# Altium schematic symbol library SCHLIB.SchLib: 2608 symbols (part 14 of 20)
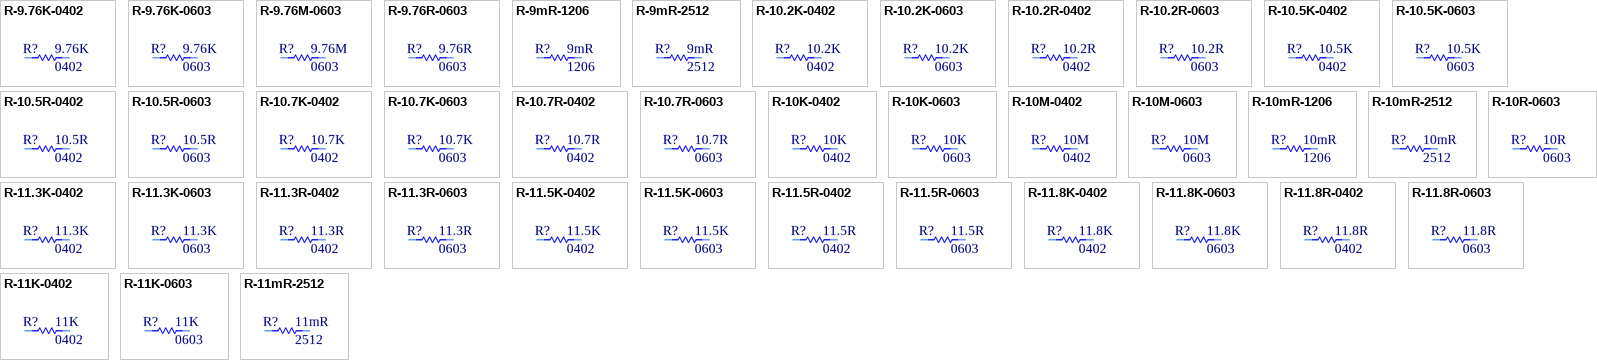
[diagram p96: symbols R-9.76K-0402 to R-11mR-2512]

## R-9.76K-0402
designator R?, comment Package: 0402  (hidden comment: 9.76K)
RES 9.76K OHM 1% 1/16W 0402; Manufacturer Part Number: RC0402FR-079K76L; Manufacturer: YAGEO; Tolerance: 0.01; Power: 0.063W; Temperature Coefficient: ±100ppm/°C; Object  Type: Part; Design Item ID: R-9.76K-0402; Value: 9.76K; Composition: Thick Film; Features: Moisture Resistant; Operating Temperature: -55°C ~ 155°C; Height - Seated (Max): 0.40mm; Category: Resistor
footprint R0402
pins: 1, 2

## R-9.76K-0603
designator R?, comment Package: 0603  (hidden comment: 9.76K)
RES SMD 9.76K OHM 1% 1/10W 0603; Manufacturer Part Number: CRCW06039K76FKEA; Manufacturer: Vishay Dale; Tolerance: 0.01; Power: 0.1W; Temperature Coefficient: ±100ppm/°C; Object  Type: Part; Design Item ID: R-9.76K-0603; Value: 9.76K; Composition: Thick Film; Features: Automotive AEC-Q200; Operating Temperature: -55°C ~ 155°C; Height - Seated (Max): 0.50mm; Category: Resistor
footprint R0603
pins: 1, 2

## R-9.76M-0603
designator R?, comment Package: 0603  (hidden comment: 9.76M)
RES SMD 9.76M OHM 1% 1/10W 0603; Manufacturer Part Number: CRCW06039M76FKEA; Manufacturer: Vishay Dale; Tolerance: 0.01; Power: 0.1W; Temperature Coefficient: ±100ppm/°C; Object  Type: Part; Design Item ID: R-9.76M-0603; Value: 9.76M; Composition: Thick Film; Features: Automotive AEC-Q200; Operating Temperature: -55°C ~ 155°C; Height - Seated (Max): 0.50mm; Category: Resistor
footprint R0603
pins: 1, 2

## R-9.76R-0603
designator R?, comment Package: 0603  (hidden comment: 9.76R)
RES SMD 9.76 OHM 1% 1/10W 0603; Manufacturer Part Number: CRCW06039R76FKEA; Manufacturer: Vishay Dale; Tolerance: 0.01; Power: 0.1W; Temperature Coefficient: ±100ppm/°C; Object  Type: Part; Design Item ID: R-9.76R-0603; Value: 9.76R; Composition: Thick Film; Features: Automotive AEC-Q200; Operating Temperature: -55°C ~ 155°C; Height - Seated (Max): 0.50mm; Category: Resistor
footprint R0603
pins: 1, 2

## R-9mR-1206
designator R?, comment Package: 1206  (hidden comment: 9mR)
RES 0.009 OHM 1% 1/4W 1206; Manufacturer Part Number: WSL12069L000FEA; Manufacturer: Vishay Dale; Tolerance: 0.01; Power: 0.25W; Temperature Coefficient: ±75ppm/°C; Object  Type: Part; Design Item ID: R-9mR-1206; Value: 9mR; Composition: Metal Element; Features: Anti-Sulfur, Automotive AEC-Q200, Current Sense, Moisture Resistant, Pulse Withstanding; Operating Temperature: -65°C ~ 170°C; Height - Seated (Max): 0.89mm; Category: Resistor
footprint R1206
pins: 1, 2

## R-9mR-2512
designator R?, comment Package: 2512  (hidden comment: 9mR)
RES 0.009 OHM 1% 1W 2512; Manufacturer Part Number: WSL25129L000FEA; Manufacturer: Vishay Dale; Tolerance: 0.01; Temperature Coefficient: ±75ppm/°C; Object  Type: Part; Design Item ID: R-9mR-2512; Value: 9mR; Power: 1W; Composition: Metal Element; Features: Anti-Sulfur, Automotive AEC-Q200, Current Sense, Moisture Resistant, Pulse Withstanding; Operating Temperature: -65°C ~ 170°C; Height - Seated (Max): 0.89mm; Category: Resistor
footprint R2512
pins: 1, 2

## R-10.2K-0402
designator R?, comment Package: 0402  (hidden comment: 10.2K)
RES 10.2K OHM 1% 1/16W 0402; Manufacturer Part Number: RC0402FR-0710K2L; Manufacturer: YAGEO; Tolerance: 0.01; Power: 0.063W; Temperature Coefficient: ±100ppm/°C; Object  Type: Part; Design Item ID: R-10.2K-0402; Value: 10.2K; Composition: Thick Film; Features: Moisture Resistant; Operating Temperature: -55°C ~ 155°C; Height - Seated (Max): 0.40mm; Category: Resistor
footprint R0402
pins: 1, 2

## R-10.2K-0603
designator R?, comment Package: 0603  (hidden comment: 10.2K)
RES SMD 10.2K OHM 1% 1/10W 0603; Manufacturer Part Number: CRCW060310K2FKEA; Manufacturer: Vishay Dale; Tolerance: 0.01; Power: 0.1W; Temperature Coefficient: ±100ppm/°C; Object  Type: Part; Design Item ID: R-10.2K-0603; Value: 10.2K; Composition: Thick Film; Features: Automotive AEC-Q200; Operating Temperature: -55°C ~ 155°C; Height - Seated (Max): 0.50mm; Category: Resistor
footprint R0603
pins: 1, 2

## R-10.2R-0402
designator R?, comment Package: 0402  (hidden comment: 10.2R)
RES 10.2 OHM 1% 1/16W 0402; Manufacturer Part Number: RC0402FR-0710R2L; Manufacturer: YAGEO; Tolerance: 0.01; Power: 0.063W; Temperature Coefficient: ±100ppm/°C; Object  Type: Part; Design Item ID: R-10.2R-0402; Value: 10.2R; Composition: Thick Film; Features: Moisture Resistant; Operating Temperature: -55°C ~ 155°C; Height - Seated (Max): 0.40mm; Category: Resistor
footprint R0402
pins: 1, 2

## R-10.2R-0603
designator R?, comment Package: 0603  (hidden comment: 10.2R)
RES SMD 10.2 OHM 1% 1/10W 0603; Manufacturer Part Number: CRCW060310R2FKEA; Manufacturer: Vishay Dale; Tolerance: 0.01; Power: 0.1W; Temperature Coefficient: ±100ppm/°C; Object  Type: Part; Design Item ID: R-10.2R-0603; Value: 10.2R; Composition: Thick Film; Features: Automotive AEC-Q200; Operating Temperature: -55°C ~ 155°C; Height - Seated (Max): 0.50mm; Category: Resistor
footprint R0603
pins: 1, 2

## R-10.5K-0402
designator R?, comment Package: 0402  (hidden comment: 10.5K)
RES 10.5K OHM 1% 1/16W 0402; Manufacturer Part Number: RC0402FR-0710K5L; Manufacturer: YAGEO; Tolerance: 0.01; Power: 0.063W; Temperature Coefficient: ±100ppm/°C; Object  Type: Part; Design Item ID: R-10.5K-0402; Value: 10.5K; Composition: Thick Film; Features: Moisture Resistant; Operating Temperature: -55°C ~ 155°C; Height - Seated (Max): 0.40mm; Category: Resistor
footprint R0402
pins: 1, 2

## R-10.5K-0603
designator R?, comment Package: 0603  (hidden comment: 10.5K)
RES SMD 10.5K OHM 1% 1/10W 0603; Manufacturer Part Number: CRCW060310K5FKEA; Manufacturer: Vishay Dale; Tolerance: 0.01; Power: 0.1W; Temperature Coefficient: ±100ppm/°C; Object  Type: Part; Design Item ID: R-10.5K-0603; Value: 10.5K; Composition: Thick Film; Features: Automotive AEC-Q200; Operating Temperature: -55°C ~ 155°C; Height - Seated (Max): 0.50mm; Category: Resistor
footprint R0603
pins: 1, 2

## R-10.5R-0402
designator R?, comment Package: 0402  (hidden comment: 10.5R)
RES 10.5 OHM 1% 1/16W 0402; Manufacturer Part Number: RC0402FR-0710R5L; Manufacturer: YAGEO; Tolerance: 0.01; Power: 0.063W; Temperature Coefficient: ±100ppm/°C; Object  Type: Part; Design Item ID: R-10.5R-0402; Value: 10.5R; Composition: Thick Film; Features: Moisture Resistant; Operating Temperature: -55°C ~ 155°C; Height - Seated (Max): 0.40mm; Category: Resistor
footprint R0402
pins: 1, 2

## R-10.5R-0603
designator R?, comment Package: 0603  (hidden comment: 10.5R)
RES SMD 10.5 OHM 1% 1/10W 0603; Manufacturer Part Number: CRCW060310R5FKEA; Manufacturer: Vishay Dale; Tolerance: 0.01; Power: 0.1W; Temperature Coefficient: ±100ppm/°C; Object  Type: Part; Design Item ID: R-10.5R-0603; Value: 10.5R; Composition: Thick Film; Features: Automotive AEC-Q200; Operating Temperature: -55°C ~ 155°C; Height - Seated (Max): 0.50mm; Category: Resistor
footprint R0603
pins: 1, 2

## R-10.7K-0402
designator R?, comment Package: 0402  (hidden comment: 10.7K)
RES 10.7K OHM 1% 1/16W 0402; Manufacturer Part Number: RC0402FR-0710K7L; Manufacturer: YAGEO; Tolerance: 0.01; Power: 0.063W; Temperature Coefficient: ±100ppm/°C; Object  Type: Part; Design Item ID: R-10.7K-0402; Value: 10.7K; Composition: Thick Film; Features: Moisture Resistant; Operating Temperature: -55°C ~ 155°C; Height - Seated (Max): 0.40mm; Category: Resistor
footprint R0402
pins: 1, 2

## R-10.7K-0603
designator R?, comment Package: 0603  (hidden comment: 10.7K)
RES SMD 10.7K OHM 1% 1/10W 0603; Manufacturer Part Number: CRCW060310K7FKEA; Manufacturer: Vishay Dale; Tolerance: 0.01; Power: 0.1W; Temperature Coefficient: ±100ppm/°C; Object  Type: Part; Design Item ID: R-10.7K-0603; Value: 10.7K; Composition: Thick Film; Features: Automotive AEC-Q200; Operating Temperature: -55°C ~ 155°C; Height - Seated (Max): 0.50mm; Category: Resistor
footprint R0603
pins: 1, 2

## R-10.7R-0402
designator R?, comment Package: 0402  (hidden comment: 10.7R)
RES 10.7 OHM 1% 1/16W 0402; Manufacturer Part Number: RC0402FR-0710R7L; Manufacturer: YAGEO; Tolerance: 0.01; Power: 0.063W; Temperature Coefficient: ±100ppm/°C; Object  Type: Part; Design Item ID: R-10.7R-0402; Value: 10.7R; Composition: Thick Film; Features: Moisture Resistant; Operating Temperature: -55°C ~ 155°C; Height - Seated (Max): 0.40mm; Category: Resistor
footprint R0402
pins: 1, 2

## R-10.7R-0603
designator R?, comment Package: 0603  (hidden comment: 10.7R)
RES SMD 10.7 OHM 1% 1/10W 0603; Manufacturer Part Number: CRCW060310R7FKEA; Manufacturer: Vishay Dale; Tolerance: 0.01; Power: 0.1W; Temperature Coefficient: ±100ppm/°C; Object  Type: Part; Design Item ID: R-10.7R-0603; Value: 10.7R; Composition: Thick Film; Features: Automotive AEC-Q200; Operating Temperature: -55°C ~ 155°C; Height - Seated (Max): 0.50mm; Category: Resistor
footprint R0603
pins: 1, 2

## R-10K-0402
designator R?, comment Package: 0402  (hidden comment: 10K)
RES 10K OHM 1% 1/16W 0402; Manufacturer Part Number: RC0402FR-0710KL; Manufacturer: YAGEO; Tolerance: 0.01; Power: 0.063W; Temperature Coefficient: ±100ppm/°C; Object  Type: Part; Design Item ID: R-10K-0402; Value: 10K; Composition: Thick Film; Features: Moisture Resistant; Operating Temperature: -55°C ~ 155°C; Height - Seated (Max): 0.40mm; Category: Resistor
footprint R0402
pins: 1, 2

## R-10K-0603
designator R?, comment Package: 0603  (hidden comment: 10K)
RES SMD 10K OHM 1% 1/10W 0603; Manufacturer Part Number: CRCW060310K0FKEA; Manufacturer: Vishay Dale; Tolerance: 0.01; Power: 0.1W; Temperature Coefficient: ±100ppm/°C; Object  Type: Part; Design Item ID: R-10K-0603; Value: 10K; Composition: Thick Film; Features: Automotive AEC-Q200; Operating Temperature: -55°C ~ 155°C; Height - Seated (Max): 0.50mm; Category: Resistor
footprint R0603
pins: 1, 2

## R-10M-0402
designator R?, comment Package: 0402  (hidden comment: 10M)
RES 10M OHM 1% 1/16W 0402; Manufacturer Part Number: RC0402FR-0710ML; Manufacturer: YAGEO; Tolerance: 0.01; Power: 0.063W; Temperature Coefficient: ±100ppm/°C; Object  Type: Part; Design Item ID: R-10M-0402; Value: 10M; Composition: Thick Film; Features: Moisture Resistant; Operating Temperature: -55°C ~ 155°C; Height - Seated (Max): 0.40mm; Category: Resistor
footprint R0402
pins: 1, 2

## R-10M-0603
designator R?, comment Package: 0603  (hidden comment: 10M)
RES SMD 10M OHM 1% 1/10W 0603; Manufacturer Part Number: CRCW060310M0FKEA; Manufacturer: Vishay Dale; Tolerance: 0.01; Power: 0.1W; Temperature Coefficient: ±100ppm/°C; Object  Type: Part; Design Item ID: R-10M-0603; Value: 10M; Composition: Thick Film; Features: Automotive AEC-Q200; Operating Temperature: -55°C ~ 155°C; Height - Seated (Max): 0.50mm; Category: Resistor
footprint R0603
pins: 1, 2

## R-10mR-1206
designator R?, comment Package: 1206  (hidden comment: 10mR)
RES 0.01 OHM 1% 1/4W 1206; Manufacturer Part Number: WSL1206R0100FEA; Manufacturer: Vishay Dale; Tolerance: 0.01; Power: 0.25W; Temperature Coefficient: ±75ppm/°C; Object  Type: Part; Design Item ID: R-10mR-1206; Value: 10mR; Composition: Metal Element; Features: Anti-Sulfur, Automotive AEC-Q200, Current Sense, Moisture Resistant, Pulse Withstanding; Operating Temperature: -65°C ~ 170°C; Height - Seated (Max): 0.89mm; Category: Resistor
footprint R1206
pins: 1, 2

## R-10mR-2512
designator R?, comment Package: 2512  (hidden comment: 10mR)
RES 0.01 OHM 1% 1W 2512; Manufacturer Part Number: WSL2512R0100FEA; Manufacturer: Vishay Dale; Tolerance: 0.01; Temperature Coefficient: ±75ppm/°C; Object  Type: Part; Design Item ID: R-10mR-2512; Value: 10mR; Power: 1W; Composition: Metal Element; Features: Anti-Sulfur, Automotive AEC-Q200, Current Sense, Moisture Resistant, Pulse Withstanding; Operating Temperature: -65°C ~ 170°C; Height - Seated (Max): 0.89mm; Category: Resistor
footprint R2512
pins: 1, 2

## R-10R-0603
designator R?, comment Package: 0603  (hidden comment: 10R)
RES SMD 10 OHM 1% 1/10W 0603; Manufacturer Part Number: CRCW060310R0FKEA; Manufacturer: Vishay Dale; Tolerance: 0.01; Power: 0.1W; Temperature Coefficient: ±100ppm/°C; Object  Type: Part; Design Item ID: R-10R-0603; Value: 10R; Composition: Thick Film; Features: Automotive AEC-Q200; Operating Temperature: -55°C ~ 155°C; Height - Seated (Max): 0.50mm; Category: Resistor
footprint R0603
pins: 1, 2

## R-11.3K-0402
designator R?, comment Package: 0402  (hidden comment: 11.3K)
RES 11.3K OHM 1% 1/16W 0402; Manufacturer Part Number: RC0402FR-0711K3L; Manufacturer: YAGEO; Tolerance: 0.01; Power: 0.063W; Temperature Coefficient: ±100ppm/°C; Object  Type: Part; Design Item ID: R-11.3K-0402; Value: 11.3K; Composition: Thick Film; Features: Moisture Resistant; Operating Temperature: -55°C ~ 155°C; Height - Seated (Max): 0.40mm; Category: Resistor
footprint R0402
pins: 1, 2

## R-11.3K-0603
designator R?, comment Package: 0603  (hidden comment: 11.3K)
RES SMD 11.3K OHM 1% 1/10W 0603; Manufacturer Part Number: CRCW060311K3FKEA; Manufacturer: Vishay Dale; Tolerance: 0.01; Power: 0.1W; Temperature Coefficient: ±100ppm/°C; Object  Type: Part; Design Item ID: R-11.3K-0603; Value: 11.3K; Composition: Thick Film; Features: Automotive AEC-Q200; Operating Temperature: -55°C ~ 155°C; Height - Seated (Max): 0.50mm; Category: Resistor
footprint R0603
pins: 1, 2

## R-11.3R-0402
designator R?, comment Package: 0402  (hidden comment: 11.3R)
RES 11.3 OHM 1% 1/16W 0402; Manufacturer Part Number: RC0402FR-0711R3L; Manufacturer: YAGEO; Tolerance: 0.01; Power: 0.063W; Temperature Coefficient: ±100ppm/°C; Object  Type: Part; Design Item ID: R-11.3R-0402; Value: 11.3R; Composition: Thick Film; Features: Moisture Resistant; Operating Temperature: -55°C ~ 155°C; Height - Seated (Max): 0.40mm; Category: Resistor
footprint R0402
pins: 1, 2

## R-11.3R-0603
designator R?, comment Package: 0603  (hidden comment: 11.3R)
RES SMD 11.3 OHM 1% 1/10W 0603; Manufacturer Part Number: CRCW060311R3FKEA; Manufacturer: Vishay Dale; Tolerance: 0.01; Power: 0.1W; Temperature Coefficient: ±100ppm/°C; Object  Type: Part; Design Item ID: R-11.3R-0603; Value: 11.3R; Composition: Thick Film; Features: Automotive AEC-Q200; Operating Temperature: -55°C ~ 155°C; Height - Seated (Max): 0.50mm; Category: Resistor
footprint R0603
pins: 1, 2

## R-11.5K-0402
designator R?, comment Package: 0402  (hidden comment: 11.5K)
RES 11.5K OHM 1% 1/16W 0402; Manufacturer Part Number: RC0402FR-0711K5L; Manufacturer: YAGEO; Tolerance: 0.01; Power: 0.063W; Temperature Coefficient: ±100ppm/°C; Object  Type: Part; Design Item ID: R-11.5K-0402; Value: 11.5K; Composition: Thick Film; Features: Moisture Resistant; Operating Temperature: -55°C ~ 155°C; Height - Seated (Max): 0.40mm; Category: Resistor
footprint R0402
pins: 1, 2

## R-11.5K-0603
designator R?, comment Package: 0603  (hidden comment: 11.5K)
RES SMD 11.5K OHM 1% 1/10W 0603; Manufacturer Part Number: CRCW060311K5FKEA; Manufacturer: Vishay Dale; Tolerance: 0.01; Power: 0.1W; Temperature Coefficient: ±100ppm/°C; Object  Type: Part; Design Item ID: R-11.5K-0603; Value: 11.5K; Composition: Thick Film; Features: Automotive AEC-Q200; Operating Temperature: -55°C ~ 155°C; Height - Seated (Max): 0.50mm; Category: Resistor
footprint R0603
pins: 1, 2

## R-11.5R-0402
designator R?, comment Package: 0402  (hidden comment: 11.5R)
RES 11.5 OHM 1% 1/16W 0402; Manufacturer Part Number: RC0402FR-0711R5L; Manufacturer: YAGEO; Tolerance: 0.01; Power: 0.063W; Temperature Coefficient: ±100ppm/°C; Object  Type: Part; Design Item ID: R-11.5R-0402; Value: 11.5R; Composition: Thick Film; Features: Moisture Resistant; Operating Temperature: -55°C ~ 155°C; Height - Seated (Max): 0.40mm; Category: Resistor
footprint R0402
pins: 1, 2

## R-11.5R-0603
designator R?, comment Package: 0603  (hidden comment: 11.5R)
RES SMD 11.5 OHM 1% 1/10W 0603; Manufacturer Part Number: CRCW060311R5FKEA; Manufacturer: Vishay Dale; Tolerance: 0.01; Power: 0.1W; Temperature Coefficient: ±100ppm/°C; Object  Type: Part; Design Item ID: R-11.5R-0603; Value: 11.5R; Composition: Thick Film; Features: Automotive AEC-Q200; Operating Temperature: -55°C ~ 155°C; Height - Seated (Max): 0.50mm; Category: Resistor
footprint R0603
pins: 1, 2

## R-11.8K-0402
designator R?, comment Package: 0402  (hidden comment: 11.8K)
RES 11.8K OHM 1% 1/16W 0402; Manufacturer Part Number: RC0402FR-0711K8L; Manufacturer: YAGEO; Tolerance: 0.01; Power: 0.063W; Temperature Coefficient: ±100ppm/°C; Object  Type: Part; Design Item ID: R-11.8K-0402; Value: 11.8K; Composition: Thick Film; Features: Moisture Resistant; Operating Temperature: -55°C ~ 155°C; Height - Seated (Max): 0.40mm; Category: Resistor
footprint R0402
pins: 1, 2

## R-11.8K-0603
designator R?, comment Package: 0603  (hidden comment: 11.8K)
RES SMD 11.8K OHM 1% 1/10W 0603; Manufacturer Part Number: CRCW060311K8FKEA; Manufacturer: Vishay Dale; Tolerance: 0.01; Power: 0.1W; Temperature Coefficient: ±100ppm/°C; Object  Type: Part; Design Item ID: R-11.8K-0603; Value: 11.8K; Composition: Thick Film; Features: Automotive AEC-Q200; Operating Temperature: -55°C ~ 155°C; Height - Seated (Max): 0.50mm; Category: Resistor
footprint R0603
pins: 1, 2

## R-11.8R-0402
designator R?, comment Package: 0402  (hidden comment: 11.8R)
RES 11.8 OHM 1% 1/16W 0402; Manufacturer Part Number: RC0402FR-0711R8L; Manufacturer: YAGEO; Tolerance: 0.01; Power: 0.063W; Temperature Coefficient: ±100ppm/°C; Object  Type: Part; Design Item ID: R-11.8R-0402; Value: 11.8R; Composition: Thick Film; Features: Moisture Resistant; Operating Temperature: -55°C ~ 155°C; Height - Seated (Max): 0.40mm; Category: Resistor
footprint R0402
pins: 1, 2

## R-11.8R-0603
designator R?, comment Package: 0603  (hidden comment: 11.8R)
RES SMD 11.8 OHM 1% 1/10W 0603; Manufacturer Part Number: CRCW060311R8FKEA; Manufacturer: Vishay Dale; Tolerance: 0.01; Power: 0.1W; Temperature Coefficient: ±100ppm/°C; Object  Type: Part; Design Item ID: R-11.8R-0603; Value: 11.8R; Composition: Thick Film; Features: Automotive AEC-Q200; Operating Temperature: -55°C ~ 155°C; Height - Seated (Max): 0.50mm; Category: Resistor
footprint R0603
pins: 1, 2

## R-11K-0402
designator R?, comment Package: 0402  (hidden comment: 11K)
RES 11K OHM 1% 1/16W 0402; Manufacturer Part Number: RC0402FR-0711KL; Manufacturer: YAGEO; Tolerance: 0.01; Power: 0.063W; Temperature Coefficient: ±100ppm/°C; Object  Type: Part; Design Item ID: R-11K-0402; Value: 11K; Composition: Thick Film; Features: Moisture Resistant; Operating Temperature: -55°C ~ 155°C; Height - Seated (Max): 0.40mm; Category: Resistor
footprint R0402
pins: 1, 2

## R-11K-0603
designator R?, comment Package: 0603  (hidden comment: 11K)
RES SMD 11K OHM 1% 1/10W 0603; Manufacturer Part Number: CRCW060311K0FKEA; Manufacturer: Vishay Dale; Tolerance: 0.01; Power: 0.1W; Temperature Coefficient: ±100ppm/°C; Object  Type: Part; Design Item ID: R-11K-0603; Value: 11K; Composition: Thick Film; Features: Automotive AEC-Q200; Operating Temperature: -55°C ~ 155°C; Height - Seated (Max): 0.50mm; Category: Resistor
footprint R0603
pins: 1, 2

## R-11mR-2512
designator R?, comment Package: 2512  (hidden comment: 11mR)
RES 0.011 OHM 1% 1W 2512; Manufacturer Part Number: WSL2512R0110FEA; Manufacturer: Vishay Dale; Tolerance: 0.01; Temperature Coefficient: ±75ppm/°C; Object  Type: Part; Design Item ID: R-11mR-2512; Value: 11mR; Power: 1W; Composition: Metal Element; Features: Anti-Sulfur, Automotive AEC-Q200, Current Sense, Moisture Resistant, Pulse Withstanding; Operating Temperature: -65°C ~ 170°C; Height - Seated (Max): 0.89mm; Category: Resistor
footprint R2512
pins: 1, 2

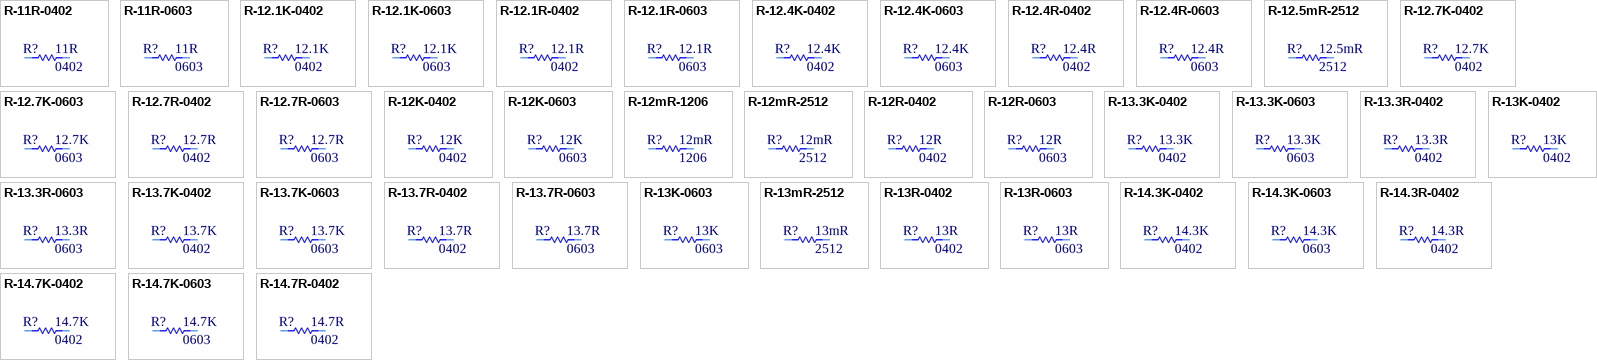
[diagram p58: symbols R-11R-0402 to R-14.7R-0402]

## R-11R-0402
designator R?, comment Package: 0402  (hidden comment: 11R)
RES 11 OHM 1% 1/16W 0402; Manufacturer Part Number: RC0402FR-0711RL; Manufacturer: YAGEO; Tolerance: 0.01; Power: 0.063W; Temperature Coefficient: ±100ppm/°C; Object  Type: Part; Design Item ID: R-11R-0402; Value: 11R; Composition: Thick Film; Features: Moisture Resistant; Operating Temperature: -55°C ~ 155°C; Height - Seated (Max): 0.40mm; Category: Resistor
footprint R0402
pins: 1, 2

## R-11R-0603
designator R?, comment Package: 0603  (hidden comment: 11R)
RES SMD 11 OHM 1% 1/10W 0603; Manufacturer Part Number: CRCW060311R0FKEA; Manufacturer: Vishay Dale; Tolerance: 0.01; Power: 0.1W; Temperature Coefficient: ±100ppm/°C; Object  Type: Part; Design Item ID: R-11R-0603; Value: 11R; Composition: Thick Film; Features: Automotive AEC-Q200; Operating Temperature: -55°C ~ 155°C; Height - Seated (Max): 0.50mm; Category: Resistor
footprint R0603
pins: 1, 2

## R-12.1K-0402
designator R?, comment Package: 0402  (hidden comment: 12.1K)
RES 12.1K OHM 1% 1/16W 0402; Manufacturer Part Number: RC0402FR-0712K1L; Manufacturer: YAGEO; Tolerance: 0.01; Power: 0.063W; Temperature Coefficient: ±100ppm/°C; Object  Type: Part; Design Item ID: R-12.1K-0402; Value: 12.1K; Composition: Thick Film; Features: Moisture Resistant; Operating Temperature: -55°C ~ 155°C; Height - Seated (Max): 0.40mm; Category: Resistor
footprint R0402
pins: 1, 2

## R-12.1K-0603
designator R?, comment Package: 0603  (hidden comment: 12.1K)
RES SMD 12.1K OHM 1% 1/10W 0603; Manufacturer Part Number: CRCW060312K1FKEA; Manufacturer: Vishay Dale; Tolerance: 0.01; Power: 0.1W; Temperature Coefficient: ±100ppm/°C; Object  Type: Part; Design Item ID: R-12.1K-0603; Value: 12.1K; Composition: Thick Film; Features: Automotive AEC-Q200; Operating Temperature: -55°C ~ 155°C; Height - Seated (Max): 0.50mm; Category: Resistor
footprint R0603
pins: 1, 2

## R-12.1R-0402
designator R?, comment Package: 0402  (hidden comment: 12.1R)
RES 12.1 OHM 1% 1/16W 0402; Manufacturer Part Number: RC0402FR-0712R1L; Manufacturer: YAGEO; Tolerance: 0.01; Power: 0.063W; Temperature Coefficient: ±100ppm/°C; Object  Type: Part; Design Item ID: R-12.1R-0402; Value: 12.1R; Composition: Thick Film; Features: Moisture Resistant; Operating Temperature: -55°C ~ 155°C; Height - Seated (Max): 0.40mm; Category: Resistor
footprint R0402
pins: 1, 2

## R-12.1R-0603
designator R?, comment Package: 0603  (hidden comment: 12.1R)
RES SMD 12.1 OHM 1% 1/10W 0603; Manufacturer Part Number: CRCW060312R1FKEA; Manufacturer: Vishay Dale; Tolerance: 0.01; Power: 0.1W; Temperature Coefficient: ±100ppm/°C; Object  Type: Part; Design Item ID: R-12.1R-0603; Value: 12.1R; Composition: Thick Film; Features: Automotive AEC-Q200; Operating Temperature: -55°C ~ 155°C; Height - Seated (Max): 0.50mm; Category: Resistor
footprint R0603
pins: 1, 2

## R-12.4K-0402
designator R?, comment Package: 0402  (hidden comment: 12.4K)
RES 12.4K OHM 1% 1/16W 0402; Manufacturer Part Number: RC0402FR-0712K4L; Manufacturer: YAGEO; Tolerance: 0.01; Power: 0.063W; Temperature Coefficient: ±100ppm/°C; Object  Type: Part; Design Item ID: R-12.4K-0402; Value: 12.4K; Composition: Thick Film; Features: Moisture Resistant; Operating Temperature: -55°C ~ 155°C; Height - Seated (Max): 0.40mm; Category: Resistor
footprint R0402
pins: 1, 2

## R-12.4K-0603
designator R?, comment Package: 0603  (hidden comment: 12.4K)
RES SMD 12.4K OHM 1% 1/10W 0603; Manufacturer Part Number: CRCW060312K4FKEA; Manufacturer: Vishay Dale; Tolerance: 0.01; Power: 0.1W; Temperature Coefficient: ±100ppm/°C; Object  Type: Part; Design Item ID: R-12.4K-0603; Value: 12.4K; Composition: Thick Film; Features: Automotive AEC-Q200; Operating Temperature: -55°C ~ 155°C; Height - Seated (Max): 0.50mm; Category: Resistor
footprint R0603
pins: 1, 2

## R-12.4R-0402
designator R?, comment Package: 0402  (hidden comment: 12.4R)
RES 12.4 OHM 1% 1/16W 0402; Manufacturer Part Number: RC0402FR-0712R4L; Manufacturer: YAGEO; Tolerance: 0.01; Power: 0.063W; Temperature Coefficient: ±100ppm/°C; Object  Type: Part; Design Item ID: R-12.4R-0402; Value: 12.4R; Composition: Thick Film; Features: Moisture Resistant; Operating Temperature: -55°C ~ 155°C; Height - Seated (Max): 0.40mm; Category: Resistor
footprint R0402
pins: 1, 2

## R-12.4R-0603
designator R?, comment Package: 0603  (hidden comment: 12.4R)
RES SMD 12.4 OHM 1% 1/10W 0603; Manufacturer Part Number: CRCW060312R4FKEA; Manufacturer: Vishay Dale; Tolerance: 0.01; Power: 0.1W; Temperature Coefficient: ±100ppm/°C; Object  Type: Part; Design Item ID: R-12.4R-0603; Value: 12.4R; Composition: Thick Film; Features: Automotive AEC-Q200; Operating Temperature: -55°C ~ 155°C; Height - Seated (Max): 0.50mm; Category: Resistor
footprint R0603
pins: 1, 2

## R-12.5mR-2512
designator R?, comment Package: 2512  (hidden comment: 12.5mR)
WSL-2512 .0125 1% EA E3; Manufacturer Part Number: WSL2512R0125FEA; Manufacturer: Vishay Dale; Tolerance: 0.01; Power: 1W; Temperature Coefficient: ±75ppm/°C; Object  Type: Part; Design Item ID: R-12.5mR-2512; Composition: Metal Element; Features: Anti-Sulfur, Automotive AEC-Q200, Current Sense, Moisture Resistant, Pulse Withstanding; Operating Temperature: -65°C ~ 170°C; Height - Seated (Max): 0.89mm; Category: Resistor; Value: 12.5mR
footprint R2512
pins: 1, 2

## R-12.7K-0402
designator R?, comment Package: 0402  (hidden comment: 12.7K)
RES 12.7K OHM 1% 1/16W 0402; Manufacturer Part Number: RC0402FR-0712K7L; Manufacturer: YAGEO; Tolerance: 0.01; Power: 0.063W; Temperature Coefficient: ±100ppm/°C; Object  Type: Part; Design Item ID: R-12.7K-0402; Value: 12.7K; Composition: Thick Film; Features: Moisture Resistant; Operating Temperature: -55°C ~ 155°C; Height - Seated (Max): 0.40mm; Category: Resistor
footprint R0402
pins: 1, 2

## R-12.7K-0603
designator R?, comment Package: 0603  (hidden comment: 12.7K)
RES SMD 12.7K OHM 1% 1/10W 0603; Manufacturer Part Number: CRCW060312K7FKEA; Manufacturer: Vishay Dale; Tolerance: 0.01; Power: 0.1W; Temperature Coefficient: ±100ppm/°C; Object  Type: Part; Design Item ID: R-12.7K-0603; Value: 12.7K; Composition: Thick Film; Features: Automotive AEC-Q200; Operating Temperature: -55°C ~ 155°C; Height - Seated (Max): 0.50mm; Category: Resistor
footprint R0603
pins: 1, 2

## R-12.7R-0402
designator R?, comment Package: 0402  (hidden comment: 12.7R)
RES 12.7 OHM 1% 1/16W 0402; Manufacturer Part Number: RC0402FR-0712R7L; Manufacturer: YAGEO; Tolerance: 0.01; Power: 0.063W; Temperature Coefficient: ±100ppm/°C; Object  Type: Part; Design Item ID: R-12.7R-0402; Value: 12.7R; Composition: Thick Film; Features: Moisture Resistant; Operating Temperature: -55°C ~ 155°C; Height - Seated (Max): 0.40mm; Category: Resistor
footprint R0402
pins: 1, 2

## R-12.7R-0603
designator R?, comment Package: 0603  (hidden comment: 12.7R)
RES SMD 12.7 OHM 1% 1/10W 0603; Manufacturer Part Number: CRCW060312R7FKEA; Manufacturer: Vishay Dale; Tolerance: 0.01; Power: 0.1W; Temperature Coefficient: ±100ppm/°C; Object  Type: Part; Design Item ID: R-12.7R-0603; Value: 12.7R; Composition: Thick Film; Features: Automotive AEC-Q200; Operating Temperature: -55°C ~ 155°C; Height - Seated (Max): 0.50mm; Category: Resistor
footprint R0603
pins: 1, 2

## R-12K-0402
designator R?, comment Package: 0402  (hidden comment: 12K)
RES 12K OHM 1% 1/16W 0402; Manufacturer Part Number: RC0402FR-0712KL; Manufacturer: YAGEO; Tolerance: 0.01; Power: 0.063W; Temperature Coefficient: ±100ppm/°C; Object  Type: Part; Design Item ID: R-12K-0402; Value: 12K; Composition: Thick Film; Features: Moisture Resistant; Operating Temperature: -55°C ~ 155°C; Height - Seated (Max): 0.40mm; Category: Resistor
footprint R0402
pins: 1, 2

## R-12K-0603
designator R?, comment Package: 0603  (hidden comment: 12K)
RES SMD 12K OHM 1% 1/10W 0603; Manufacturer Part Number: CRCW060312K0FKEA; Manufacturer: Vishay Dale; Tolerance: 0.01; Power: 0.1W; Temperature Coefficient: ±100ppm/°C; Object  Type: Part; Design Item ID: R-12K-0603; Value: 12K; Composition: Thick Film; Features: Automotive AEC-Q200; Operating Temperature: -55°C ~ 155°C; Height - Seated (Max): 0.50mm; Category: Resistor
footprint R0603
pins: 1, 2

## R-12mR-1206
designator R?, comment Package: 1206  (hidden comment: 12mR)
RES 0.012 OHM 1% 1/4W 1206; Manufacturer Part Number: WSL1206R0120FEA; Manufacturer: Vishay Dale; Tolerance: 0.01; Power: 0.25W; Temperature Coefficient: ±75ppm/°C; Object  Type: Part; Design Item ID: R-12mR-1206; Value: 12mR; Composition: Metal Element; Features: Anti-Sulfur, Automotive AEC-Q200, Current Sense, Moisture Resistant, Pulse Withstanding; Operating Temperature: -65°C ~ 170°C; Height - Seated (Max): 0.89mm; Category: Resistor
footprint R1206
pins: 1, 2

## R-12mR-2512
designator R?, comment Package: 2512  (hidden comment: 12mR)
RES 0.012 OHM 1% 1W 2512; Manufacturer Part Number: WSL2512R0120FEA; Manufacturer: Vishay Dale; Tolerance: 0.01; Temperature Coefficient: ±75ppm/°C; Object  Type: Part; Design Item ID: R-12mR-2512; Value: 12mR; Power: 1W; Composition: Metal Element; Features: Anti-Sulfur, Automotive AEC-Q200, Current Sense, Moisture Resistant, Pulse Withstanding; Operating Temperature: -65°C ~ 170°C; Height - Seated (Max): 0.89mm; Category: Resistor
footprint R2512
pins: 1, 2

## R-12R-0402
designator R?, comment Package: 0402  (hidden comment: 12R)
RES 12 OHM 1% 1/16W 0402; Manufacturer Part Number: RC0402FR-0712RL; Manufacturer: YAGEO; Tolerance: 0.01; Power: 0.063W; Temperature Coefficient: ±100ppm/°C; Object  Type: Part; Design Item ID: R-12R-0402; Value: 12R; Composition: Thick Film; Features: Moisture Resistant; Operating Temperature: -55°C ~ 155°C; Height - Seated (Max): 0.40mm; Category: Resistor
footprint R0402
pins: 1, 2

## R-12R-0603
designator R?, comment Package: 0603  (hidden comment: 12R)
RES SMD 12 OHM 1% 1/10W 0603; Manufacturer Part Number: CRCW060312R0FKEA; Manufacturer: Vishay Dale; Tolerance: 0.01; Power: 0.1W; Temperature Coefficient: ±100ppm/°C; Object  Type: Part; Design Item ID: R-12R-0603; Value: 12R; Composition: Thick Film; Features: Automotive AEC-Q200; Operating Temperature: -55°C ~ 155°C; Height - Seated (Max): 0.50mm; Category: Resistor
footprint R0603
pins: 1, 2

## R-13.3K-0402
designator R?, comment Package: 0402  (hidden comment: 13.3K)
RES 13.3K OHM 1% 1/16W 0402; Manufacturer Part Number: RC0402FR-0713K3L; Manufacturer: YAGEO; Tolerance: 0.01; Power: 0.063W; Temperature Coefficient: ±100ppm/°C; Object  Type: Part; Design Item ID: R-13.3K-0402; Value: 13.3K; Composition: Thick Film; Features: Moisture Resistant; Operating Temperature: -55°C ~ 155°C; Height - Seated (Max): 0.40mm; Category: Resistor
footprint R0402
pins: 1, 2

## R-13.3K-0603
designator R?, comment Package: 0603  (hidden comment: 13.3K)
RES SMD 13.3K OHM 1% 1/10W 0603; Manufacturer Part Number: CRCW060313K3FKEA; Manufacturer: Vishay Dale; Tolerance: 0.01; Power: 0.1W; Temperature Coefficient: ±100ppm/°C; Object  Type: Part; Design Item ID: R-13.3K-0603; Value: 13.3K; Composition: Thick Film; Features: Automotive AEC-Q200; Operating Temperature: -55°C ~ 155°C; Height - Seated (Max): 0.50mm; Category: Resistor
footprint R0603
pins: 1, 2

## R-13.3R-0402
designator R?, comment Package: 0402  (hidden comment: 13.3R)
RES 13.3 OHM 1% 1/16W 0402; Manufacturer Part Number: RC0402FR-0713R3L; Manufacturer: YAGEO; Tolerance: 0.01; Power: 0.063W; Temperature Coefficient: ±100ppm/°C; Object  Type: Part; Design Item ID: R-13.3R-0402; Value: 13.3R; Composition: Thick Film; Features: Moisture Resistant; Operating Temperature: -55°C ~ 155°C; Height - Seated (Max): 0.40mm; Category: Resistor
footprint R0402
pins: 1, 2

## R-13.3R-0603
designator R?, comment Package: 0603  (hidden comment: 13.3R)
RES SMD 13.3 OHM 1% 1/10W 0603; Manufacturer Part Number: CRCW060313R3FKEA; Manufacturer: Vishay Dale; Tolerance: 0.01; Power: 0.1W; Temperature Coefficient: ±100ppm/°C; Object  Type: Part; Design Item ID: R-13.3R-0603; Value: 13.3R; Composition: Thick Film; Features: Automotive AEC-Q200; Operating Temperature: -55°C ~ 155°C; Height - Seated (Max): 0.50mm; Category: Resistor
footprint R0603
pins: 1, 2

## R-13.7K-0402
designator R?, comment Package: 0402  (hidden comment: 13.7K)
RES 13.7K OHM 1% 1/16W 0402; Manufacturer Part Number: RC0402FR-0713K7L; Manufacturer: YAGEO; Tolerance: 0.01; Power: 0.063W; Temperature Coefficient: ±100ppm/°C; Object  Type: Part; Design Item ID: R-13.7K-0402; Value: 13.7K; Composition: Thick Film; Features: Moisture Resistant; Operating Temperature: -55°C ~ 155°C; Height - Seated (Max): 0.40mm; Category: Resistor
footprint R0402
pins: 1, 2

## R-13.7K-0603
designator R?, comment Package: 0603  (hidden comment: 13.7K)
RES SMD 13.7K OHM 1% 1/10W 0603; Manufacturer Part Number: CRCW060313K7FKEA; Manufacturer: Vishay Dale; Tolerance: 0.01; Power: 0.1W; Temperature Coefficient: ±100ppm/°C; Object  Type: Part; Design Item ID: R-13.7K-0603; Value: 13.7K; Composition: Thick Film; Features: Automotive AEC-Q200; Operating Temperature: -55°C ~ 155°C; Height - Seated (Max): 0.50mm; Category: Resistor
footprint R0603
pins: 1, 2

## R-13.7R-0402
designator R?, comment Package: 0402  (hidden comment: 13.7R)
RES 13.7 OHM 1% 1/16W 0402; Manufacturer Part Number: RC0402FR-0713R7L; Manufacturer: YAGEO; Tolerance: 0.01; Power: 0.063W; Temperature Coefficient: ±100ppm/°C; Object  Type: Part; Design Item ID: R-13.7R-0402; Value: 13.7R; Composition: Thick Film; Features: Moisture Resistant; Operating Temperature: -55°C ~ 155°C; Height - Seated (Max): 0.40mm; Category: Resistor
footprint R0402
pins: 1, 2

## R-13.7R-0603
designator R?, comment Package: 0603  (hidden comment: 13.7R)
RES SMD 13.7 OHM 1% 1/10W 0603; Manufacturer Part Number: CRCW060313R7FKEA; Manufacturer: Vishay Dale; Tolerance: 0.01; Power: 0.1W; Temperature Coefficient: ±100ppm/°C; Object  Type: Part; Design Item ID: R-13.7R-0603; Value: 13.7R; Composition: Thick Film; Features: Automotive AEC-Q200; Operating Temperature: -55°C ~ 155°C; Height - Seated (Max): 0.50mm; Category: Resistor
footprint R0603
pins: 1, 2

## R-13K-0402
designator R?, comment Package: 0402  (hidden comment: 13K)
RES 13K OHM 1% 1/16W 0402; Manufacturer Part Number: RC0402FR-0713KL; Manufacturer: YAGEO; Tolerance: 0.01; Power: 0.063W; Temperature Coefficient: ±100ppm/°C; Object  Type: Part; Design Item ID: R-13K-0402; Value: 13K; Composition: Thick Film; Features: Moisture Resistant; Operating Temperature: -55°C ~ 155°C; Height - Seated (Max): 0.40mm; Category: Resistor
footprint R0402
pins: 1, 2

## R-13K-0603
designator R?, comment Package: 0603  (hidden comment: 13K)
RES SMD 13K OHM 1% 1/10W 0603; Manufacturer Part Number: CRCW060313K0FKEA; Manufacturer: Vishay Dale; Tolerance: 0.01; Power: 0.1W; Temperature Coefficient: ±100ppm/°C; Object  Type: Part; Design Item ID: R-13K-0603; Value: 13K; Composition: Thick Film; Features: Automotive AEC-Q200; Operating Temperature: -55°C ~ 155°C; Height - Seated (Max): 0.50mm; Category: Resistor
footprint R0603
pins: 1, 2

## R-13mR-2512
designator R?, comment Package: 2512  (hidden comment: 13mR)
RES 0.013 OHM 1% 1W 2512; Manufacturer Part Number: WSL2512R0130FEA; Manufacturer: Vishay Dale; Tolerance: 0.01; Temperature Coefficient: ±75ppm/°C; Object  Type: Part; Design Item ID: R-13mR-2512; Value: 13mR; Power: 1W; Composition: Metal Element; Features: Anti-Sulfur, Automotive AEC-Q200, Current Sense, Moisture Resistant, Pulse Withstanding; Operating Temperature: -65°C ~ 170°C; Height - Seated (Max): 0.89mm; Category: Resistor
footprint R2512
pins: 1, 2

## R-13R-0402
designator R?, comment Package: 0402  (hidden comment: 13R)
RES 13 OHM 1% 1/16W 0402; Manufacturer Part Number: RC0402FR-0713RL; Manufacturer: YAGEO; Tolerance: 0.01; Power: 0.063W; Temperature Coefficient: ±100ppm/°C; Object  Type: Part; Design Item ID: R-13R-0402; Value: 13R; Composition: Thick Film; Features: Moisture Resistant; Operating Temperature: -55°C ~ 155°C; Height - Seated (Max): 0.40mm; Category: Resistor
footprint R0402
pins: 1, 2

## R-13R-0603
designator R?, comment Package: 0603  (hidden comment: 13R)
RES SMD 13 OHM 1% 1/10W 0603; Manufacturer Part Number: CRCW060313R0FKEA; Manufacturer: Vishay Dale; Tolerance: 0.01; Power: 0.1W; Temperature Coefficient: ±100ppm/°C; Object  Type: Part; Design Item ID: R-13R-0603; Value: 13R; Composition: Thick Film; Features: Automotive AEC-Q200; Operating Temperature: -55°C ~ 155°C; Height - Seated (Max): 0.50mm; Category: Resistor
footprint R0603
pins: 1, 2

## R-14.3K-0402
designator R?, comment Package: 0402  (hidden comment: 14.3K)
RES 14.3K OHM 1% 1/16W 0402; Manufacturer Part Number: RC0402FR-0714K3L; Manufacturer: YAGEO; Tolerance: 0.01; Power: 0.063W; Temperature Coefficient: ±100ppm/°C; Object  Type: Part; Design Item ID: R-14.3K-0402; Value: 14.3K; Composition: Thick Film; Features: Moisture Resistant; Operating Temperature: -55°C ~ 155°C; Height - Seated (Max): 0.40mm; Category: Resistor
footprint R0402
pins: 1, 2

## R-14.3K-0603
designator R?, comment Package: 0603  (hidden comment: 14.3K)
RES SMD 14.3K OHM 1% 1/10W 0603; Manufacturer Part Number: CRCW060314K3FKEA; Manufacturer: Vishay Dale; Tolerance: 0.01; Power: 0.1W; Temperature Coefficient: ±100ppm/°C; Object  Type: Part; Design Item ID: R-14.3K-0603; Value: 14.3K; Composition: Thick Film; Features: Automotive AEC-Q200; Operating Temperature: -55°C ~ 155°C; Height - Seated (Max): 0.50mm; Category: Resistor
footprint R0603
pins: 1, 2

## R-14.3R-0402
designator R?, comment Package: 0402  (hidden comment: 14.3R)
RES 14.3 OHM 1% 1/16W 0402; Manufacturer Part Number: RC0402FR-0714R3L; Manufacturer: YAGEO; Tolerance: 0.01; Power: 0.063W; Temperature Coefficient: ±100ppm/°C; Object  Type: Part; Design Item ID: R-14.3R-0402; Value: 14.3R; Composition: Thick Film; Features: Moisture Resistant; Operating Temperature: -55°C ~ 155°C; Height - Seated (Max): 0.40mm; Category: Resistor
footprint R0402
pins: 1, 2

## R-14.7K-0402
designator R?, comment Package: 0402  (hidden comment: 14.7K)
RES 14.7K OHM 1% 1/16W 0402; Manufacturer Part Number: RC0402FR-0714K7L; Manufacturer: YAGEO; Tolerance: 0.01; Power: 0.063W; Temperature Coefficient: ±100ppm/°C; Object  Type: Part; Design Item ID: R-14.7K-0402; Value: 14.7K; Composition: Thick Film; Features: Moisture Resistant; Operating Temperature: -55°C ~ 155°C; Height - Seated (Max): 0.40mm; Category: Resistor
footprint R0402
pins: 1, 2

## R-14.7K-0603
designator R?, comment Package: 0603  (hidden comment: 14.7K)
RES SMD 14.7K OHM 1% 1/10W 0603; Manufacturer Part Number: CRCW060314K7FKEA; Manufacturer: Vishay Dale; Tolerance: 0.01; Power: 0.1W; Temperature Coefficient: ±100ppm/°C; Object  Type: Part; Design Item ID: R-14.7K-0603; Value: 14.7K; Composition: Thick Film; Features: Automotive AEC-Q200; Operating Temperature: -55°C ~ 155°C; Height - Seated (Max): 0.50mm; Category: Resistor
footprint R0603
pins: 1, 2

## R-14.7R-0402
designator R?, comment Package: 0402  (hidden comment: 14.7R)
RES 14.7 OHM 1% 1/16W 0402; Manufacturer Part Number: RC0402FR-0714R7L; Manufacturer: YAGEO; Tolerance: 0.01; Power: 0.063W; Temperature Coefficient: ±100ppm/°C; Object  Type: Part; Design Item ID: R-14.7R-0402; Value: 14.7R; Composition: Thick Film; Features: Moisture Resistant; Operating Temperature: -55°C ~ 155°C; Height - Seated (Max): 0.40mm; Category: Resistor
footprint R0402
pins: 1, 2

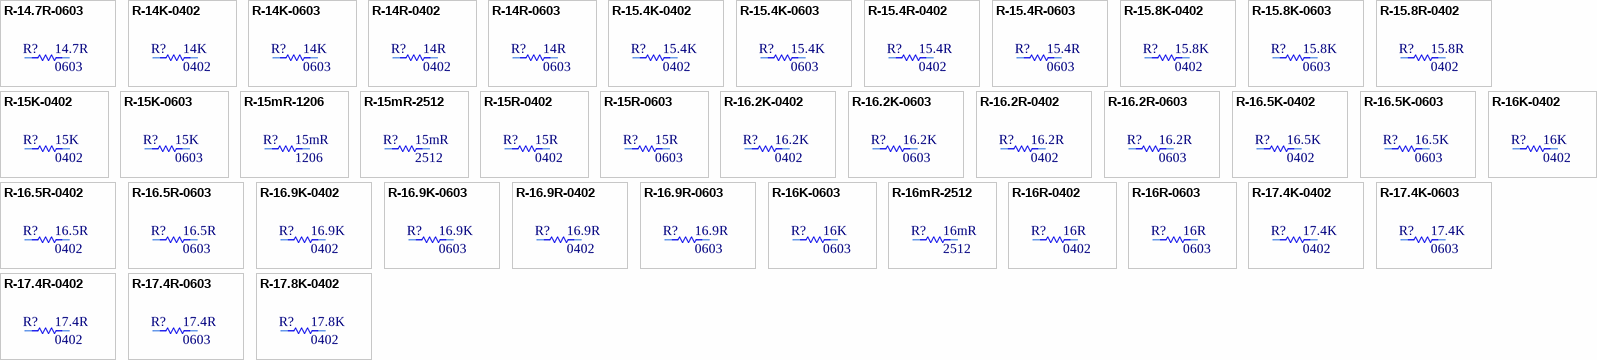
[diagram p59: symbols R-14.7R-0603 to R-17.8K-0402]

## R-14.7R-0603
designator R?, comment Package: 0603  (hidden comment: 14.7R)
RES SMD 14.7 OHM 1% 1/10W 0603; Manufacturer Part Number: CRCW060314R7FKEA; Manufacturer: Vishay Dale; Tolerance: 0.01; Power: 0.1W; Temperature Coefficient: ±100ppm/°C; Object  Type: Part; Design Item ID: R-14.7R-0603; Value: 14.7R; Composition: Thick Film; Features: Automotive AEC-Q200; Operating Temperature: -55°C ~ 155°C; Height - Seated (Max): 0.50mm; Category: Resistor
footprint R0603
pins: 1, 2

## R-14K-0402
designator R?, comment Package: 0402  (hidden comment: 14K)
RES 14K OHM 1% 1/16W 0402; Manufacturer Part Number: RC0402FR-0714KL; Manufacturer: YAGEO; Tolerance: 0.01; Power: 0.063W; Temperature Coefficient: ±100ppm/°C; Object  Type: Part; Design Item ID: R-14K-0402; Value: 14K; Composition: Thick Film; Features: Moisture Resistant; Operating Temperature: -55°C ~ 155°C; Height - Seated (Max): 0.40mm; Category: Resistor
footprint R0402
pins: 1, 2

## R-14K-0603
designator R?, comment Package: 0603  (hidden comment: 14K)
RES SMD 14K OHM 1% 1/10W 0603; Manufacturer Part Number: CRCW060314K0FKEA; Manufacturer: Vishay Dale; Tolerance: 0.01; Power: 0.1W; Temperature Coefficient: ±100ppm/°C; Object  Type: Part; Design Item ID: R-14K-0603; Value: 14K; Composition: Thick Film; Features: Automotive AEC-Q200; Operating Temperature: -55°C ~ 155°C; Height - Seated (Max): 0.50mm; Category: Resistor
footprint R0603
pins: 1, 2

## R-14R-0402
designator R?, comment Package: 0402  (hidden comment: 14R)